# Altium schematic symbol library My Library.SchLib: 1211 symbols (part 11 of 12) (continued)
## TLV70223 (continued)
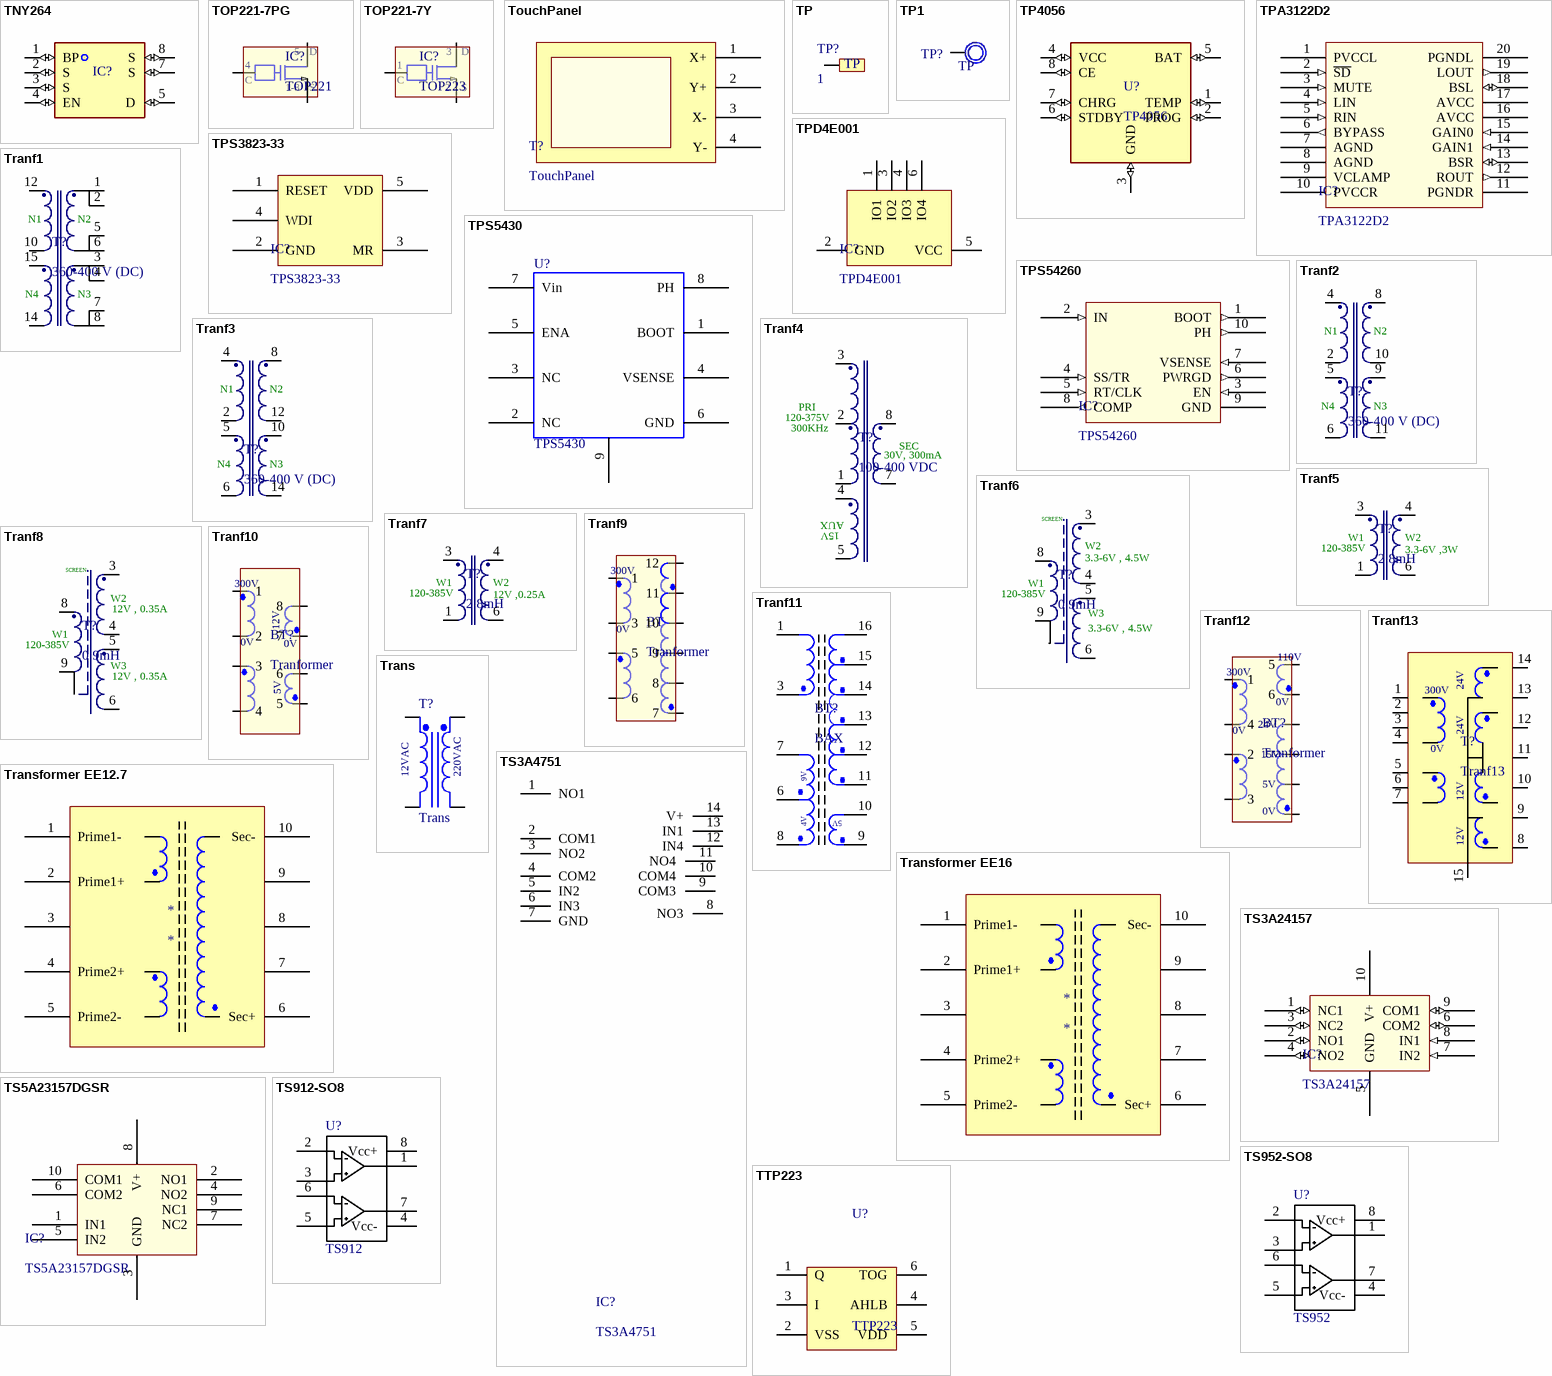
[diagram p68: symbols TNY264 to TTP223]

## TNY264
designator IC?
IC Power
footprint TNY264 (Opto)
footprint Model Name (Footprint not found)
pins: 1 BP (io), 2 S (io), 3 S (io), 4 EN (io), 5 D (io), 7 S (io), 8 S (io)

## TOP221-7PG
designator IC?, comment TOP221
Family Three-terminal Off-line PWM Switch
footprint DIP8/W0.3 (8 PIN, W 300mil, Pin to pin 100mil)
footprint SO-8 (8-Pin Small Outline Integrated Circuit 1.27 mm Pitch, IPC Medium Density)
pins: 1 S, 2 S, 3 S, 4 C, 5 D, 6 S, 7 S, 8 S
text: 1-8

## TOP221-7Y
designator IC?, comment TOP223
Family Three-terminal Off-line PWM Switch; Designed by: VanDungEvn
footprint QTO-220 (TO-220 - 1-2-3)
pins: 1 C, 2 C, 3 C
text: D; S

## TouchPanel
designator T?
4 wires touch panel; Creator: Nguyen Ba Bien; Date Created: 14-04-2010
footprint HDR1X4H (Connector; Header; 4 Position; Right Angle)
pins: 1 X+, 2 Y+, 3 X-, 4 Y-

## TP
designator TP?, comment 1
CONNECT 1
footprint TP (Footprint not found)
pins: TP1 0

## TP1
designator TP?, comment TP
Test Point; Value: Test Point
footprint TP1 (Test point)
footprint TP6 (Jac cap 6ly)
pins: 1

## TP4056
designator U?
Complete single cell Li-Ion battery with a constant current / constant voltage linear charger
footprint TP4056
pins: 1 TEMP (io), 2 PROG (io), 3 GND (io), 4 VCC (io), 5 BAT (io), 6 STDBY (io), 7 CHRG (io), 8 CE (io)

## TPA3122D2
designator IC?
15-W Stereo Class-D Audio Power Amplifier
pins: 1 PVCCL, 2 ~{SD} (in), 3 MUTE (in), 4 LIN (in), 5 RIN (in), 6 BYPASS (out), 7 AGND, 8 AGND, 9 VCLAMP, 10 PVCCR , 11 PGNDR, 12 ROUT (out), 13 BSR (io), 14 GAIN1 (in), 15 GAIN0 (in), 16 AVCC, 17 AVCC, 18 BSL (io), 19 LOUT (out), 20 PGNDL

## TPD4E001
designator IC?
footprint SOT23-6 (SOT23, 5-Leads, Body 3.0x3.0mm (max), Pitch 0.95mm, IPC Medium Density)
pins: 1 IO1, 2 GND, 3 IO2, 4 IO3, 5 VCC, 6 IO4

## TPS3823-33
designator IC?
IC reset
footprint SOT23-5 (SOT23, 5-Leads, Body 3.0x3.0mm (max), Pitch 0.95mm, IPC Medium Density)
pins: 1 RESET, 2 GND, 3 MR, 4 WDI, 5 VDD

## TPS5430
designator U?
Name: TPS5430
footprint TPS5430-1
footprint TPS5430-2
pins: 1 BOOT, 2 NC, 3 NC, 4 VSENSE, 5 ENA, 6 GND, 7 Vin, 8 PH, 9 PWR_PAD

## TPS54260
designator IC?
3.5V to 60V INPUT, 2.5A, STEP DOWN CONVERTER WITH ECO-MODE
pins: 1 BOOT (out), 2 IN (in), 3 EN (in), 4 SS/TR (in), 5 RT/CLK (in), 6 PWRGD (out), 7 VSENSE (in), 8 COMP (out), 9 GND (power), 10 PH (out)

## Tranf1
designator T?, comment 360-400 V (DC)
Resonant Converter WE-LLCR, Ui=360-400 V (DC); PartNo: 760895731; Manufacturer: Würth Elektronik eiSos GmbH; OutPut Voltage: 12 V; Output Current: 20.8A; (Input Voltage) Ui: 360-400 V (DC); ComponentLink1Description: Manufacturer; ComponentLink1URL: http://www.we-online.de; Created by: Otto Christin; Created Date: NOV 2013; ComponentLink2Description: Datasheet; ComponentLink2URL: http://www.we-online.de/katalog/media/pdf/760895731.pdf
footprint ETD44 (THT Transformer, 12-Leads, Body 48 x 46 mm)
pins: 1, 2, 3, 4, 5, 6, 7, 8, 10, 12, 14, 15
text: N1; N2; N4; N3

## Tranf2
designator T?, comment 360-400 V (DC)
Resonant Converter WE-LLCR, Ui=360-400 V (DC); PartNo: 760895441; Manufacturer: Würth Elektronik eiSos GmbH; OutPut Voltage: 24 V; Output Current: 6.2A; (Input Voltage) Ui: 360-400 V (DC); ComponentLink1Description: Manufacturer; ComponentLink1URL: http://www.we-online.de; Created by: Otto Christin; Created Date: NOV 2013; ComponentLink2Description: Datasheet; ComponentLink2URL: http://katalog.we-online.de/pbs/datasheet/760895441.pdf
footprint ETD34 (THT Transformer, 12-Leads, Body 36 x36 mm)
pins: 2, 4, 5, 6, 8, 9, 10, 11
text: N1; N2; N4; N3

## Tranf3
designator T?, comment 360-400 V (DC)
Resonant Converter WE-LLCR, Ui=360-400 V (DC); PartNo: 760895651; Manufacturer: Würth Elektronik eiSos GmbH; OutPut Voltage: 48 V; Output Current: 4.2A; (Input Voltage) Ui: 360-400 V (DC); ComponentLink1Description: Manufacturer; ComponentLink1URL: http://www.we-online.de; Created by: Otto Christin; Created Date: NOV 2013; ComponentLink2Description: Datasheet; ComponentLink2URL: http://katalog.we-online.de/pbs/datasheet/760895651.pdf
footprint ETD39 (THT Transformer, 14-Leads, Body 44 x43 mm)
pins: 2, 4, 5, 6, 8, 10, 12, 14
text: N1; N2; N4; N3

## Tranf4
designator T?, comment 100-400 VDC
Flyback Transformer suitable or LT3573/ LT3574/ LT3575/ LT3748 WE-FB, Ui=100-400 VDC; PartNo: 750811048; Manufacturer: Würth Elektronik eiSos GmbH; Ui: 100-400 VDC; ComponentLink1Description: Manufacturer; ComponentLink1URL: http://www.we-online.de; Created by: Otto Christin; Created Date: OCT 2013; ComponentLink2Description: Datasheet; ComponentLink2URL: http://katalog.we-online.de/pbs/datasheet/750811048.pdf
footprint EE16/8/5 (TH, 9-Leads, Body 24.38x20.32mm (max), Pitch 3.50mm)
pins: 1, 2, 3, 4, 5, 7, 8
text: PRI; 120-375V; 300KHz; SEC; 30V, 300mA; AUX; 15V

## Tranf5
designator T?, comment 2.8mH
Off-Line Transformer WE-UNIT , L=2.8mH; PartNo: 749118105; Manufacturer: Würth Elektronik eiSos GmbH; Turns Ratio: 18.9:1; Input Votage (AC): 85-265; Output voltage (DC): 5; Output Current (A): 0.6; Inductance: 2.8mH; ComponentLink1Description: Manufacturer; ComponentLink1URL: http://www.we-online.de; Created by: Otto Christin; Created Date: OCT 2013; ComponentLink2Description: Datasheet; ComponentLink2URL: http://www.we-online.de/katalog/media/pdf/749118105.pdf
footprint EE13/7/4-Vertical/(EF12.6) (THT, 6-Leads, Body 15 x11mm (max), Pitch 3.81mm)
pins: 1, 3, 4, 6
text: W1; W2; 120-385V; 3.3-6V ,3W

## Tranf6
designator T?, comment 0.9mH
Off-Line Transformer WE-UNIT , L=0.9mH; PartNo: 749118205; Manufacturer: Würth Elektronik eiSos GmbH; Turns Ratio: 19:1:1; Input Voltage (AC): 85-265; Output Voltage (DC): 5; Output Current (A): 0.6; Inductance: 0.9mH; ComponentLink1Description: Manufacturer; ComponentLink1URL: http://www.we-online.de; Created by: Otto Christin; Created Date: OCT 2013; ComponentLink2Description: Datasheet; ComponentLink2URL: http://www.we-online.de/katalog/media/pdf/749118205.pdf
footprint EE16/7/4 (E16) (THT, 10-Leads, Body 18x16.5mm (max), Pitch 2.7mm)
pins: 3, 4, 5, 6, 8, 9
text: SCREEN; W2; 3.3-6V , 4.5W; W1; 120-385V; W3

## Tranf7
designator T?, comment 2.8mH
Off-Line Transformer WE-UNIT , L=2.8mH; PartNo: 7491181012; Manufacturer: Würth Elektronik eiSos GmbH; Turns Ratio: 8.1:1; Input Voltage (AC): 85-265; Output Current (A): 0.25; Output Voltage (DC): 12; Inductance: 2.8mH; ComponentLink1Description: Manufacturer; ComponentLink1URL: http://www.we-online.de; Created by: Otto Christin; Created Date: OCT 2013; ComponentLink2Description: Datasheet; ComponentLink2URL: http://www.we-online.de/katalog/media/pdf/7491181012.pdf
footprint EE13/7/4-Vertical/(EF12.6) (THT, 6-Leads, Body 15 x11mm (max), Pitch 3.81mm)
pins: 1, 3, 4, 6
text: W1; W2; 120-385V; 12V ,0.25A

## Tranf8
designator T?, comment 0.9mH
Off-Line Transformer WE-UNIT , L=0.9mH; PartNo: 7491182012; Manufacturer: Würth Elektronik eiSos GmbH; Turns Ratio: 9.5:1:1; Input Voltage (AC): 85-265; Output Voltage (DC): 12; Output Current (A): 0.6; Inductance: 0.9mH; ComponentLink1Description: Manufacturer; ComponentLink1URL: http://www.we-online.de; Created by: Otto Christin; Created Date: OCT 2013; ComponentLink2Description: Datasheet; ComponentLink2URL: http://www.we-online.de/katalog/media/pdf/7491182012.pdf
footprint EE16/7/4 (E16) (THT, 10-Leads, Body 18x16.5mm (max), Pitch 2.7mm)
pins: 3, 4, 5, 6, 8, 9
text: SCREEN; W2; 12V , 0.35A; W1; 120-385V; W3

## Tranf9
designator BT, comment Tranformer
Value: BA xung
footprint EE32
pins: 1, 3, 5, 6, 7, 8, 9, 10, 11, 12
text: 300V; 0V

## Tranf10
designator BT?, comment Tranformer
Value: BA xung
footprint EE25
pins: 1, 2, 3, 4, 5, 6, 7, 8
text: 300V; 12V; 0V; 5V

## Tranf11
designator BT?, comment BAX
Bien ap xung DVD; Designed by: VanDungEvn; Value: BAX
footprint BAX_DVD3 (Bien ap xung DVD3)
pins: 1, 3, 6, 7, 8, 9, 10, 11, 12, 13, 14, 15, 16
text: 9V; 5V; 4V

## Tranf12
designator BT?, comment Tranformer
Value: BA xung
footprint EE16/7/4 (E16) (THT, 10-Leads, Body 18x16.5mm (max), Pitch 2.7mm)
pins: 1, 2, 3, 4, 5, 6, 7, 8, 9, 10
text: 110V; 300V; 0V; 24V; 15V; 5V

## Tranf13
designator T?
ATX Tranfomer
footprint Model Name (Model Description)
pins: 1, 2, 3, 4, 5, 6, 7, 8, 9, 10, 11, 12, 13, 14, 15
text: 24V; 300V; 0V; 12V

## Trans
designator T?
Transformer (12V-6VA); Published: 8-Jun-2000; LatestRevisionDate: 17-Jul-2002; LatestRevisionNote: Re-released for DXP Platform.; PackageReference: TRF_4; Publisher: Altium Limited; PackageDescription: Transformer; 4 Leads
footprint Transformer 12V-6VA (Transformer; 4 Leads)
pins: 1 Pri+, 2 Pri-, 3 Sec+, 4 Sec-
text: 12VAC; 220VAC

## Transformer EE12.7
designator *
footprint Transformer EE12.7
pins: 1 Prime1-, 2 Prime1+, 3, 4 Prime2+, 5 Prime2-, 6 Sec+, 7, 8, 9, 10 Sec-

## Transformer EE16
designator *
footprint Transformer SW (Transformer; 4 Leads)
footprint Transformer SW (Transformer; 4 Leads)
pins: 1 Prime1-, 2 Prime1+, 3, 4 Prime2+, 5 Prime2-, 6 Sec+, 7, 8, 9, 10 Sec-

## TS3A4751
designator IC?
Analog Switch ICs
pins: 1 NO1, 2 COM1, 3 NO2, 4 COM2, 5 IN2, 6 IN3, 7 GND, 8 NO3, 9 COM3, 10 COM4, 11 NO4, 12 IN4, 13 IN1, 14 V+

## TS3A24157
designator IC?
Analog Switch ICs
footprint TSSOP50P490X110-10N (TSSOP, 10-Leads, Body 3,1x3,1mm (max), Pitch 0,50mm, IPC Medium Density)
pins: 1 NC1 (io), 2 NO1 (io), 3 NC2 (io), 4 NO2 (io), 5 GND (power), 6 COM2 (io), 7 IN2 (in), 8 IN1 (in), 9 COM1 (io), 10 V+ (power)

## TS5A23157DGSR
designator IC?
Analog Switch ICs
footprint TSSOP50P490X110-10N (TSSOP, 10-Leads, Body 3,1x3,1mm (max), Pitch 0,50mm, IPC Medium Density)
pins: 1 IN1, 2 NO1, 3 GND, 4 NO2, 5 IN2, 6 COM2, 7 NC2, 8 V+, 9 NC1, 10 COM1

## TS912-SO8
designator U?, comment TS912
DUAL RAIL TO RAIL OPAMP; Manufacturer Part Number: TS921ID; Manufacturer: STMicroelectronics; Number of Circuits: 1; Slew Rate: 1.3 V/µs; Current - Output / Channel: 80mA; Voltage - Supply, Single/Dual (±): 2.7 V ~ 12 V; Output Type: Rail-to-Rail; Current - Input Bias: 15nA; Gain Bandwidth Product: 4MHz; Amplifier Type: General Purpose; Voltage - Input Offset: 3000µV; Current - Supply: 1mA; NI?: *; O?: *; Section:: *; Supplier 1: Digi-Key; Supplier Part Number 1: TS921ID-ND; Category: Integrated Circuits (ICs); Supplier Part Number: TS921ID-ND; Packaging: Tube; RoHS: RoHS Compliant; Operating Temperature: -40°C ~ 125°C; Supplier: Digi-Key; Package / Case: 8-SOIC (3.9mm Width)
footprint SO8
footprint DIP8
pins: 1, 2, 3, 4 Vcc-, 5, 6, 7, 8 Vcc+

## TS952-SO8
designator U?, comment TS952
DUAL RAIL TO RAIL OPAMP; Manufacturer Part Number: TS952IYDT; Manufacturer: STMicroelectronics; Gain Bandwidth Product: 3MHz; Current - Supply: 950µA; Output Type: Rail-to-Rail; Current - Input Bias: 35nA; Amplifier Type: General Purpose; Voltage - Supply, Single/Dual (±): 2.7 V ~ 12 V; Slew Rate: 1 V/µs; Voltage - Input Offset: 6000µV; Current - Output / Channel: 10mA; Number of Circuits: 2; NI?: *; O?: *; Section:: *; Supplier 1: Digi-Key; Supplier Part Number 1: 497-4777-6-ND; Operating Temperature: -40°C ~ 125°C; Package / Case: 8-SOIC (3.9mm Width); Supplier: Digi-Key; Category: Integrated Circuits (ICs); Packaging: Digi-Reel®; Supplier Part Number: 497-4777-6-ND; RoHS: RoHS Compliant
footprint SO8
footprint DIP8
pins: 1, 2, 3, 4 Vcc-, 5, 6, 7, 8 Vcc+

## TTP223
designator U?
Half-Bridge Driver
footprint SOT23-6
pins: 1 Q, 2 VSS, 3 I, 4 AHLB, 5 VDD, 6 TOG

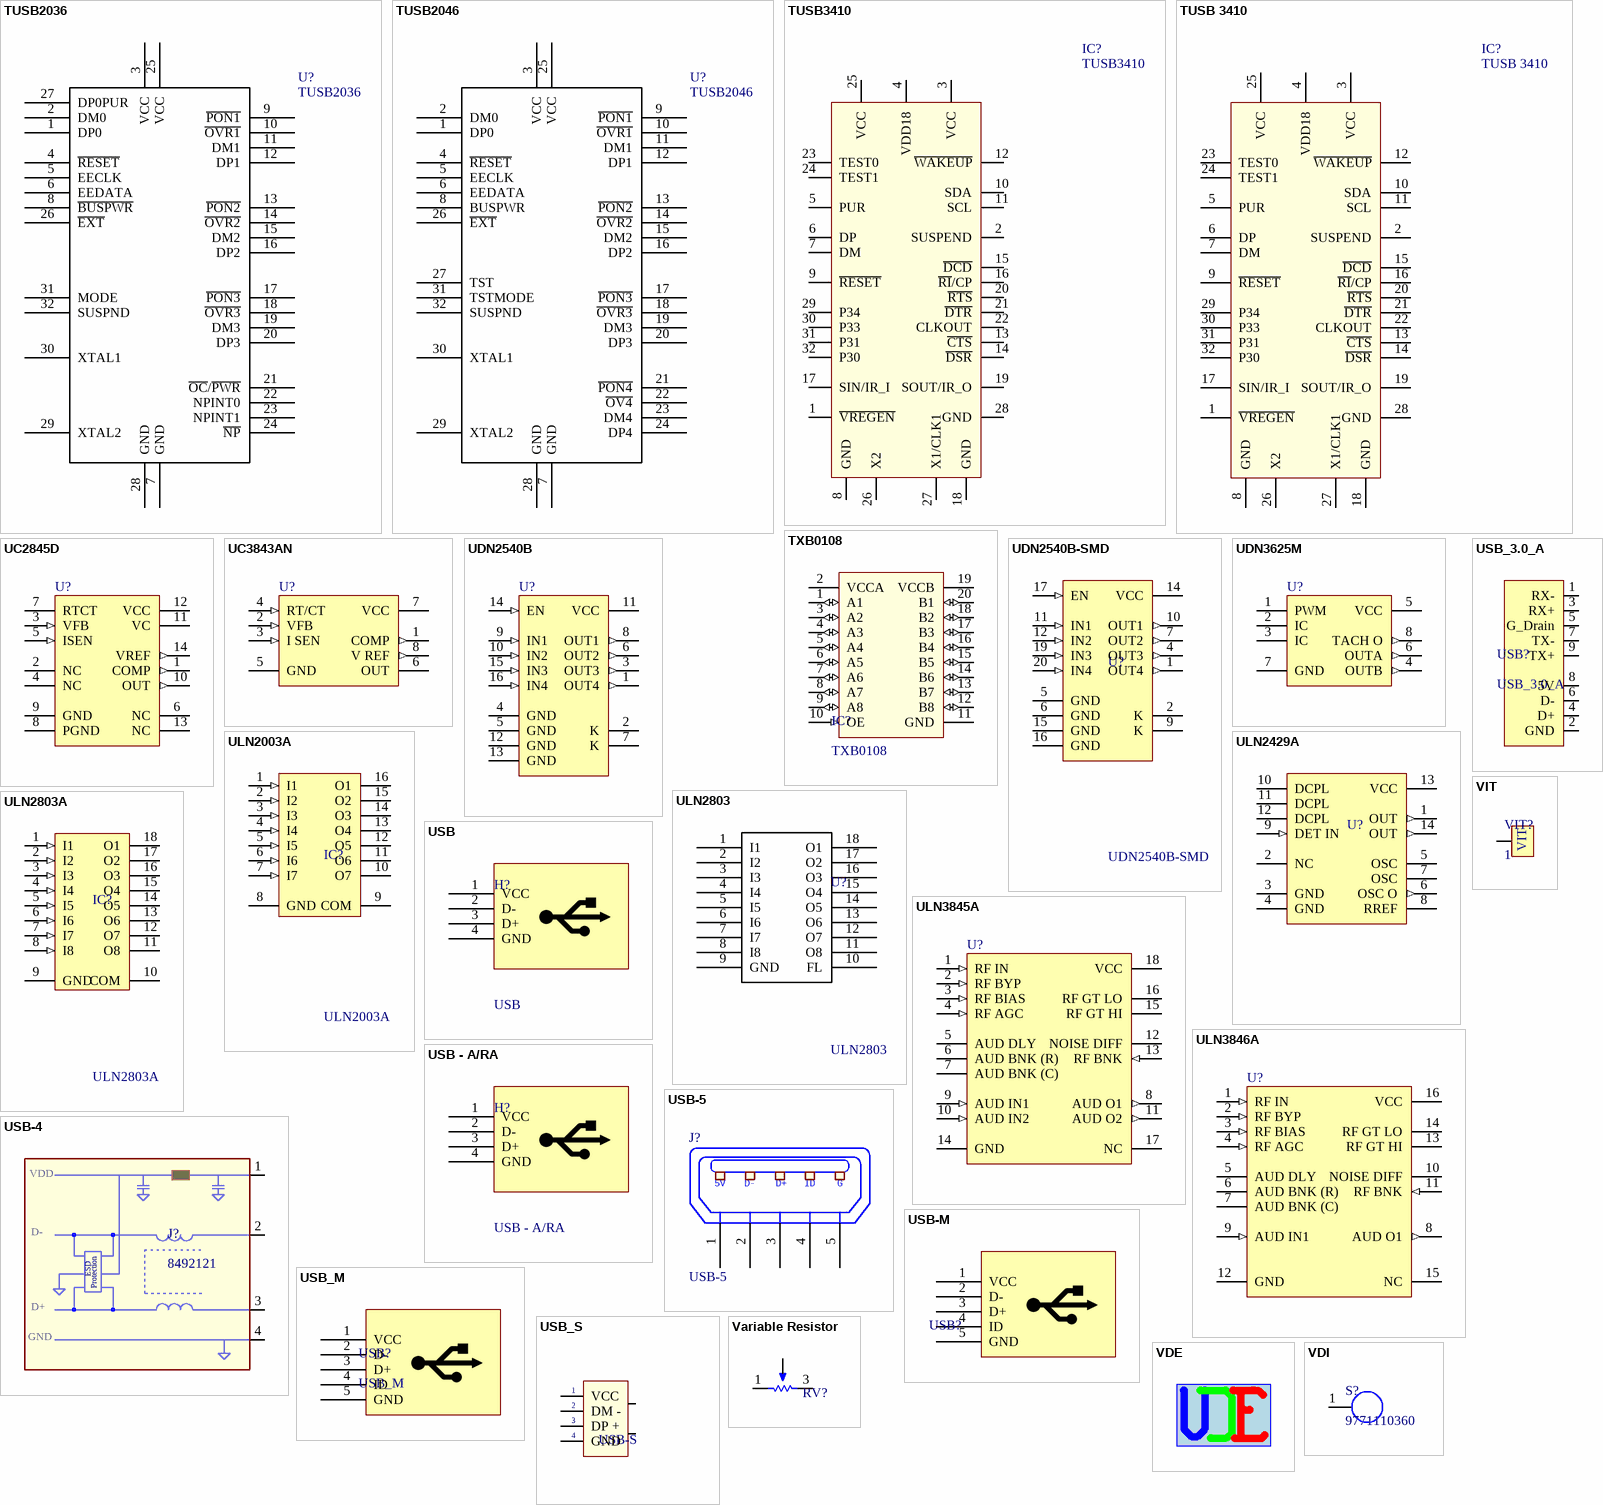
[diagram p69: symbols TUSB2036 to VIT]

## TUSB2036
designator U?
4 PORT USB HUB STATE MACHINE; Manufacturer Part Number: TUSB2036VFG4; Manufacturer: Texas Instruments; Current - Supply: 40mA; Interface: Serial EEPROM; Controller Type: USB Hub; Voltage - Supply: 3 V ~ 3.6 V; Supplier 1: Digi-Key; Supplier Part Number 1: 296-17784-ND; Supplier Part Number: 296-17784-ND; RoHS: RoHS Compliant; Supplier: Digi-Key; Package / Case: 32-LQFP; Operating Temperature: 0°C ~ 70°C; Category: Integrated Circuits (ICs); Packaging: Tray
footprint PQFP32 (PQFP, 32-Leads, Body 7.00x7.00mm, Pitch 0.80mm, IPC High Density)
pins: 1 DP0, 2 DM0, 3 VCC, 4 ~{RESET}, 5 EECLK, 6 EEDATA, 7 GND, 8 ~{BUSPWR}, 9 ~{PON1}, 10 ~{OVR1}, 11 DM1, 12 DP1, 13 ~{PON2}, 14 ~{OVR2}, 15 DM2, 16 DP2, 17 ~{PON3}, 18 ~{OVR3}, 19 DM3, 20 DP3, 21 ~{OC}/~{PWR}, 22 NPINT0, 23 NPINT1, 24 ~{NP}, 25 VCC, 26 ~{EXT}, 27 DP0PUR, 28 GND, 29 XTAL2, 30 XTAL1, 31 MODE, 32 SUSPND

## TUSB2046
designator U?
4 PORT USB HUB STATE MACHINE; Manufacturer Part Number: TUSB2046BVF; Manufacturer: Texas Instruments; Voltage - Supply: 3 V ~ 3.6 V; Controller Type: USB Hub; Interface: Serial EEPROM; Current - Supply: 40mA; Supplier 1: Digi-Key; Supplier Part Number 1: 296-11088-ND; Packaging: Tray; Operating Temperature: 0°C ~ 70°C; Package / Case: 32-LQFP; Supplier Part Number: 296-11088-ND; RoHS: RoHS Compliant; Supplier: Digi-Key; Category: Integrated Circuits (ICs)
footprint PQFP32 (PQFP, 32-Leads, Body 7.00x7.00mm, Pitch 0.80mm, IPC High Density)
pins: 1 DP0, 2 DM0, 3 VCC, 4 ~{RESET}, 5 EECLK, 6 EEDATA, 7 GND, 8 BUSPWR, 9 ~{PON1}, 10 ~{OVR1}, 11 DM1, 12 DP1, 13 ~{PON2}, 14 ~{OVR2}, 15 DM2, 16 DP2, 17 ~{PON3}, 18 ~{OVR3}, 19 DM3, 20 DP3, 21 ~{PON4}, 22 ~{OV}~{4}, 23 DM4, 24 DP4, 25 VCC, 26 ~{EXT}, 27 TST, 28 GND, 29 XTAL2, 30 XTAL1, 31 TSTMODE, 32 SUSPND

## TUSB3410
designator IC?
USB to RS232 Converter; Value: TUSB 3410
footprint TQFP32 (Thin QFP, 32-Leads, Body 9x9mm, Pitch 0.8mm, IPC Low Density)
pins: 1 ~{VREGEN}, 2 SUSPEND, 3 VCC, 4 VDD18, 5 PUR, 6 DP, 7 DM, 8 GND, 9 ~{RESET}, 10 SDA, 11 SCL, 12 ~{WAKEUP}, 13 ~{CTS}, 14 ~{DSR}, 15 ~{DCD}, 16 ~{RI}/CP, 17 SIN/IR_I, 18 GND, 19 SOUT/IR_O, 20 ~{RTS}, 21 ~{DTR}, 22 CLKOUT, 23 TEST0, 24 TEST1, 25 VCC, 26 X2, 27 X1/CLK1, 28 GND, 29 P34, 30 P33, 31 P31, 32 P30

## TUSB 3410
designator IC?
USB to RS232 Converter; Value: TUSB 3410
footprint QFP7X7-G32/X.45N (QFP; 32 Leads; Body 7 x 7 mm; Pitch 0.8 mm)
pins: 1 ~{VREGEN}, 2 SUSPEND, 3 VCC, 4 VDD18, 5 PUR, 6 DP, 7 DM, 8 GND, 9 ~{RESET}, 10 SDA, 11 SCL, 12 ~{WAKEUP}, 13 ~{CTS}, 14 ~{DSR}, 15 ~{DCD}, 16 ~{RI}/CP, 17 SIN/IR_I, 18 GND, 19 SOUT/IR_O, 20 ~{RTS}, 21 ~{DTR}, 22 CLKOUT, 23 TEST0, 24 TEST1, 25 VCC, 26 X2, 27 X1/CLK1, 28 GND, 29 P34, 30 P33, 31 P31, 32 P30

## TXB0108
designator IC?
8-BIT BIDIRECTIONAL VOLTAGE-LEVEL TRANSLATOR
pins: 1 A1 (io), 2 VCCA (power), 3 A2 (io), 4 A3 (io), 5 A4 (io), 6 A5 (io), 7 A6 (io), 8 A7 (io), 9 A8 (io), 10 OE (in), 11 GND (power), 12 B8 (io), 13 B7 (io), 14 B6 (io), 15 B5 (io), 16 B4 (io), 17 B3 (io), 18 B2 (io), 19 VCCB (power), 20 B1 (io)

## UC2845D
designator U?
Current Mode PWM Controller; Published: 24-Aug-2001; LatestRevisionDate: 13-Apr-2006; LatestRevisionNote: IPC-7351 Footprint Added.; DatasheetVersion: Oct-1998; PackageVersion: Sep-1998; PackageReference: SO14; Publisher: Altium Limited; PackageDescription: 14-Pin Small Outline Integrated Circuit 1.27 mm Pitch; Code_IPC: SOIC127P600-14; ComponentLink1Description: Manufacturer Link; ComponentLink1URL: http://www.st.com/
footprint SO14 (SOIC, 14-Leads, Body 8.60x3.90mm, Pitch 1.27mm, IPC Medium Density)
pins: 1 COMP (out), 2 NC, 3 VFB (in), 4 NC, 5 ISEN (in), 6 NC, 7 RTCT, 8 PGND (power), 9 GND (power), 10 OUT (out), 11 VC (power), 12 VCC (power), 13 NC, 14 VREF (out)

## UC3843AN
designator U?
High-Performance Current Mode PWM Controller; Published: 24-Aug-2001; LatestRevisionDate: 06-Jun-2005; LatestRevisionNote: Stylized 3D Model Added.; DatasheetVersion: Mar-1999; PackageReference: DIP8; Publisher: Altium Limited; PackageDescription: DIP; 8 Leads; Row Spacing 7.62 mm; Pitch 2.54 mm; Code_JEDEC: MO-001-AN; ComponentLink1Description: Manufacturer Link; ComponentLink1URL: http://www.st.com/; ComponentLink2Description: Datasheet; ComponentLink2URL: http://www.st.com/stonline/products/literature/ds/4298/uc3842a.pdf
footprint DIP8
footprint SO8 (SOIC, 8-Leads, Body 4.9x3.9mm, Pitch 1.27mm, IPC High Density)
pins: 1 COMP (out), 2 VFB (in), 3 I SEN (in), 4 RT/CT (in), 5 GND (power), 6 OUT (hiz), 7 VCC (power), 8 V REF (out)

## UDN2540B
designator U?
Quad Darlington Power Driver; Note: Pins (4,5) and (12,13) exist as TABS; all are internally connected (GND).; ComponentAvailability: Obsolete; Published: 13-Oct-2000; LatestRevisionDate: 06-Jun-2005; LatestRevisionNote: Stylized 3D Model Added.; DatasheetVersion: 1995; PackageVersion: 1994; PackageReference: B16; Publisher: Altium Limited; PackageDescription: DIP; 16 Leads; Row Spacing 7.62 mm; Pitch 2.54 mm; Code_JEDEC: MS-001-BB; ComponentLink1Description: Manufacturer Link; ComponentLink1URL: http://www.allegromicro.com/; ComponentLink2Description: Datasheet; ComponentLink2URL: http://www.allegromicro.com/datafile/archive/2540.pdf
footprint DIP16
pins: 1 OUT4 (out), 2 K, 3 OUT3 (out), 4 GND (power), 5 GND (power), 6 OUT2 (out), 7 K, 8 OUT1 (out), 9 IN1 (in), 10 IN2 (in), 11 VCC (power), 12 GND (power), 13 GND (power), 14 EN (in), 15 IN3 (in), 16 IN4 (in)

## UDN2540B-SMD
designator U?
Quad Darlington Power Driver; Note: Pins (4,5) and (12,13) exist as TABS; all are internally connected (GND).; ComponentAvailability: Obsolete; Published: 13-Oct-2000; LatestRevisionDate: 06-Jun-2005; LatestRevisionNote: Stylized 3D Model Added.; DatasheetVersion: 1995; PackageVersion: 1994; PackageReference: B16; Publisher: Altium Limited; PackageDescription: DIP; 16 Leads; Row Spacing 7.62 mm; Pitch 2.54 mm; Code_JEDEC: MS-001-BB; ComponentLink1Description: Manufacturer Link; ComponentLink1URL: http://www.allegromicro.com/; ComponentLink2Description: Datasheet; ComponentLink2URL: http://www.allegromicro.com/datafile/archive/2540.pdf
footprint SO20 (SOIC, 20-Leads, Body 12.60x7.50mm, Pitch 1.27mm, IPC Medium Density)
pins: 1 OUT4 (out), 2 K, 4 OUT3 (out), 5 GND (power), 6 GND (power), 7 OUT2 (out), 9 K, 10 OUT1 (out), 11 IN1 (in), 12 IN2 (in), 14 VCC (power), 15 GND (power), 16 GND (power), 17 EN (in), 19 IN3 (in), 20 IN4 (in)